# Altium footprint library pcb2D3D库101.PcbLib: 411 footprints (part 9 of 26)
Each footprint in its own frame and in the unit in brackets; x right, y up, seen from the top. Pads: shape width x height; smd on the part's side, far side on the other; paste and mask are expansions set on the pad; w line width, h text height; cw(c..) or ccw(c..) is an arc to the next point about the centre after c.
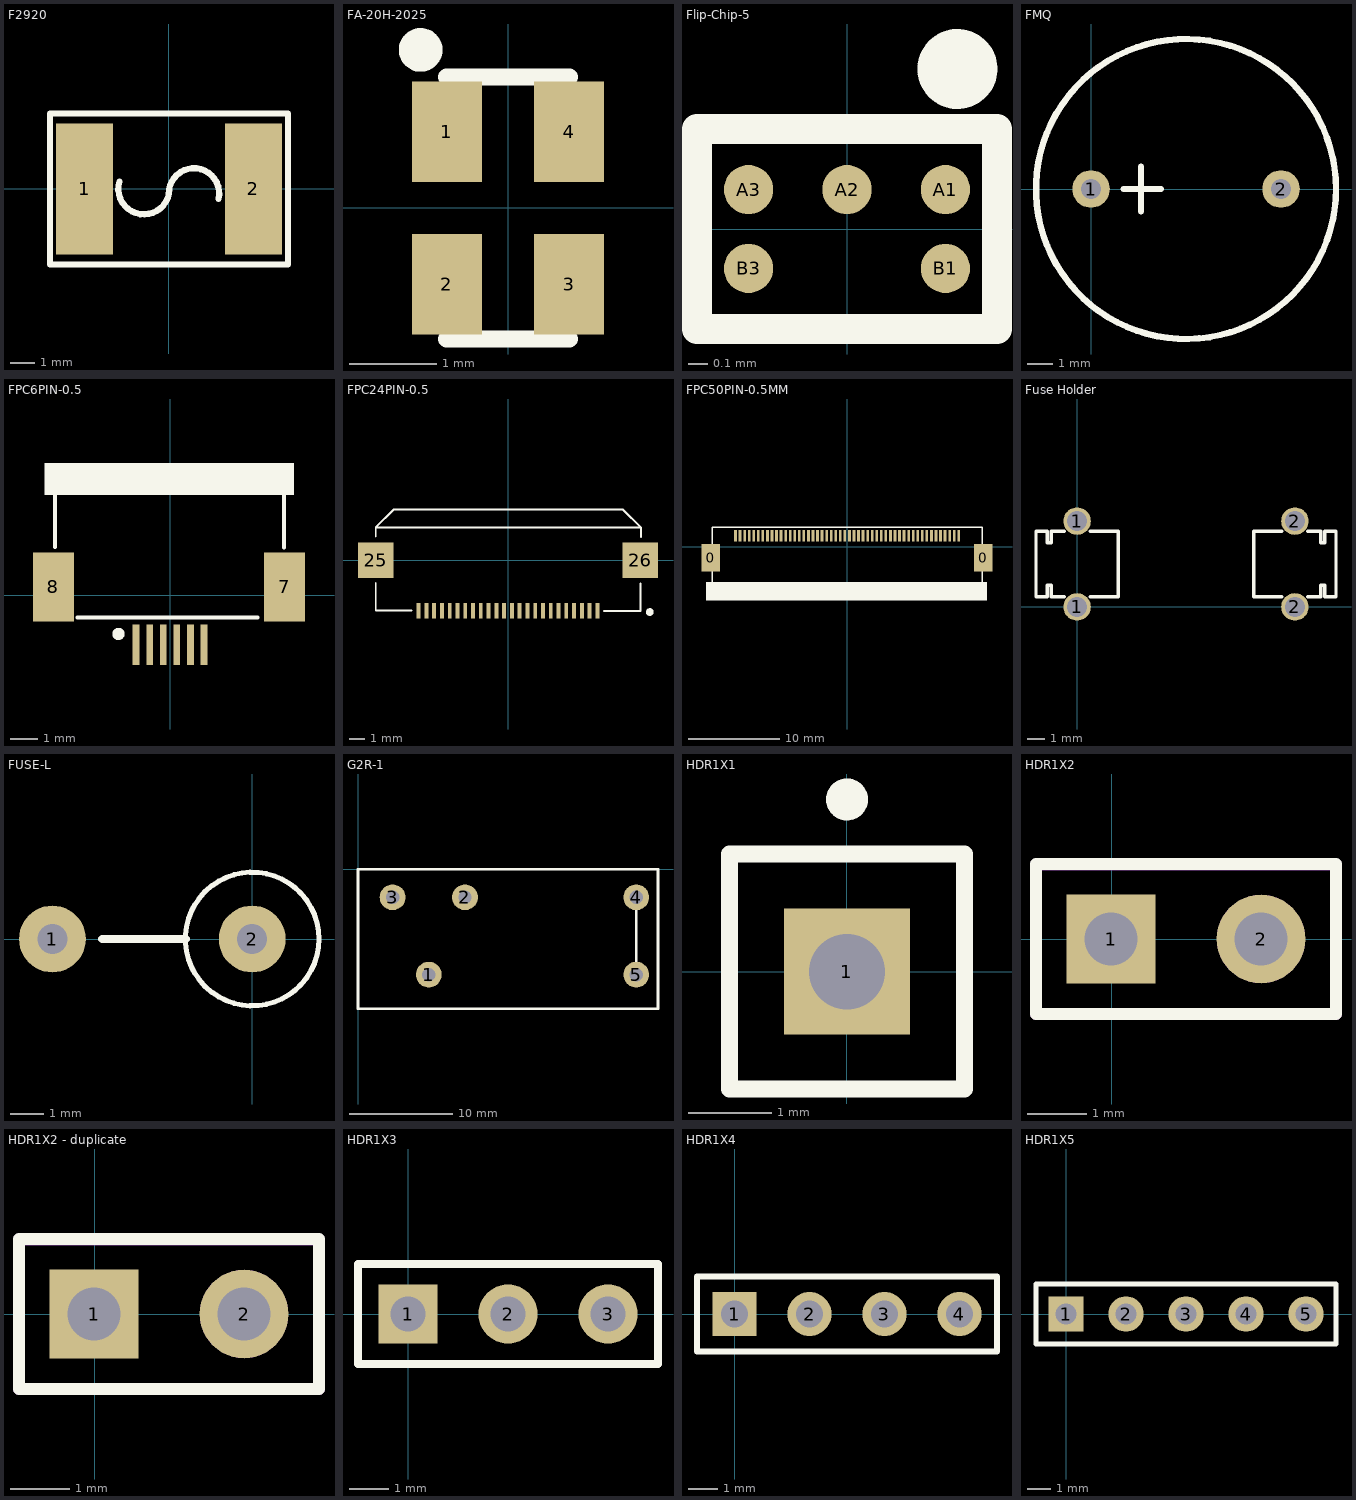
[diagram p8: the footprints below, top view; thin cyan lines are the x and y axes]

## F2920 [mm] "7452"
pads (2):
  rect 2.3x5.3 smd: 1(-3.4,0) 2(3.4,0)
TopOverlay:
  lines w0.254: -2,0.3 ccw(c-1.012,0.007) 0.018,0 ; -0.009,-0.2 cw(c1.008,-0.178) 2,-0.4 ; -4.8,-3.048 4.8,-3.048 4.8,3.048 -4.8,3.048 -4.8,-3.048
3D body: height 1, standoff 0, extent 2.7,-2.692 3.399,2.692
3D body: height 1, standoff 0, extent -3.576,-2.718 -2.878,2.667
3D body: height 1, standoff 0, extent -2.878,-2.718 3.18,2.667

## FA-20H-2025 [mm]
height 0.5
pads (4):
  rect 0.8x1.15 smd: 1(-0.7,0.875) 2(-0.7,-0.875) 3(0.7,-0.875) 4(0.7,0.875)
TopOverlay:
  circle w0.25: c-1,1.81 r0.125
  lines w0.2: -0.7,-1.5 0.7,-1.5 ; -0.7,1.5 0.7,1.5
3D body "FA-20H-2025.STEP": height 0.5, standoff 0, extent -1.005,-1.25 0.995,1.25

## Flip-Chip-5 [mm]
height 0.69
pads (5):
  round 0.25 smd mask+0.05: A1(0.5,0.2) A2(0,0.2) A3(-0.5,0.2) B1(0.5,-0.2) B3(-0.5,-0.2)
TopOverlay:
  circle w0.203: c0.561,0.813 r0.102
  lines w0.152: -0.762,-0.508 -0.762,0.508 0.762,0.508 0.762,-0.508 -0.762,-0.508
3D body "FlipChip-5.STEP": height 0.69, standoff 0, extent -0.693,-0.425 0.693,0.43

## FMQ [mm]
pads (2):
  round 1.5 hole 0.8: 1(0,0) 2(7.6,0)
TopOverlay:
  circle w0.254: c3.799,0 r6.001
  lines w0.254: 1.3,0 2.8,0 ; 2,-0.9 2,0.9
3D body "User Library-WST-1203UX.STEP": height 9.65, standoff -4.5, extent -5.727,-6 9.727,6

## FPC6PIN-0.5 [mm]
pads (8):
  rect 0.25x1.5 smd: 1(-1.25,-1.825) 2(-0.75,-1.825) 3(-0.25,-1.825) 4(0.25,-1.825) 5(0.75,-1.825) 6(1.25,-1.825)
  rect 1.524x2.54 smd: 7(4.216,0.305) 8(-4.293,0.305)
TopOverlay:
  circle w0.254: c-1.9,-1.425 r0.1
  region: 3,4.775 3,4.775 3,4.425 3,4.425
  region: 4.572,4.877 -4.623,4.877 -4.623,3.683 4.572,3.683
  lines w0.15: -4.242,1.778 -4.242,4.775 3.835,4.775 ; -3.404,-0.825 3,-0.825 ; 2.6,-0.825 3.226,-0.825 ; 4.191,1.753 4.191,4.724
3D body "FFC6PIN卧": height 2.12, standoff -0.19, extent -4.603,-1.973 4.552,4.674

## FPC24PIN-0.5 [mm] "CAMERA ROTARY FPC 24 WAY 0.5 PITCH"
pads (26):
  rect 0.25x1 smd: 1(5.75,-3.25) 2(5.25,-3.25) 3(4.75,-3.25) 4(4.25,-3.25) 5(3.75,-3.25) 6(3.25,-3.25) 7(2.75,-3.25) 8(2.25,-3.25) 9(1.75,-3.25) 10(1.25,-3.25) 11(0.75,-3.25) 12(0.25,-3.25) 13(-0.25,-3.25) 14(-0.75,-3.25) 15(-1.25,-3.25) 16(-1.75,-3.25) 17(-2.25,-3.25) 18(-2.75,-3.25) 19(-3.25,-3.25) 20(-3.75,-3.25) 21(-4.25,-3.25) 22(-4.75,-3.25) 23(-5.25,-3.25) 24(-5.75,-3.25)
  rect 2.286x2.286 smd: 25(-8.509,0) 26(8.509,0)
TopOverlay:
  circle w0.254: c9.123,-3.34 r0.117
  lines w0.127: -8.51,-3.251 -8.51,-1.48 ; -8.51,1.51 -8.51,2.11 ; 8.53,-3.251 8.53,-1.5 ; 8.54,2.11 -8.51,2.11 ; 8.56,1.49 8.56,2.09 7.399,3.251 -7.369,3.251 -8.51,2.11
  lines w0.128: -8.5,-3.24 -6.22,-3.24 ; 6.18,-3.26 8.53,-3.26
3D body "User Library-ov9655.STEP": height 5.85, standoff -0.18, extent -6.17,-0.55 6.33,20.95
3D body "33944.STEP": height 2, standoff 0, extent -8.04,-4.56 8.06,1.34

## FPC50PIN-0.5MM [mm]
pads (52):
  rect 2x3 smd: 0(-14.986,-1.219) 0(14.935,-1.219)
  rect 0.3x1.25 smd: 1(12.24,1.181) 2(11.74,1.181) 3(11.24,1.181) 4(10.74,1.181) 5(10.24,1.181) 6(9.74,1.181) 7(9.24,1.181) 8(8.74,1.181) 9(8.24,1.181) 10(7.74,1.181) 11(7.24,1.181) 12(6.74,1.181) 13(6.24,1.181) 14(5.74,1.181) 15(5.24,1.181) 16(4.74,1.181) 17(4.24,1.181) 18(3.74,1.181) 19(3.24,1.181) 20(2.74,1.181) 21(2.24,1.181) 22(1.74,1.181) 23(1.24,1.181) 24(0.74,1.181) 25(0.24,1.181) 26(-0.26,1.181) 27(-0.76,1.181) 28(-1.26,1.181) 29(-1.76,1.181) 30(-2.26,1.181) 31(-2.76,1.181) 32(-3.26,1.181) 33(-3.76,1.181) 34(-4.26,1.181) 35(-4.76,1.181) 36(-5.26,1.181) 37(-5.76,1.181) 38(-6.26,1.181) 39(-6.76,1.181) 40(-7.26,1.181) 41(-7.76,1.181) 42(-8.26,1.181) 43(-8.76,1.181) 44(-9.26,1.181) 45(-9.76,1.181) 46(-10.26,1.181) 47(-10.76,1.181) 48(-11.26,1.181) 49(-11.76,1.181) 50(-12.26,1.181)
TopOverlay:
  rectangle: -15.494,-5.944 15.342,-3.886
  lines w0.2: -14.808,-4.928 14.808,-4.928 14.808,2.108 -14.808,2.108 -14.808,-4.928
3D body "FFC50IPIN卧": height 2.1, standoff 0.05, extent -15.26,-5.759 15.24,1.391

## Fuse Holder [mm]
pads (4):
  round 1.6 hole 1.17 mask+0.06: 1(0,0) 1(0,5) 2(12.7,0) 2(12.7,5)
TopOverlay:
  lines w0.2: -0.75,0.6 -1.5,0.6 -1.5,1.25 -1.75,1.25 -1.75,0.6 -2.4,0.6 -2.4,4.4 -1.75,4.4 -1.75,3.75 -1.5,3.75 -1.5,4.4 -0.75,4.4 ; 0.75,0.6 2.4,0.6 2.4,4.4 0.75,4.4 ; 11.95,0.6 10.3,0.6 10.3,4.4 11.95,4.4 ; 13.45,0.6 14.2,0.6 14.2,1.25 14.45,1.25 14.45,0.6 15.1,0.6 15.1,4.4 14.45,4.4 14.45,3.75 14.2,3.75 14.2,4.4 13.45,4.4
3D body "User Library-01110501Z.STEP": height 7.4, standoff -2.95, extent -2.275,0 2.525,5.1
3D body "User Library-01110501Z.STEP": height 7.4, standoff -2.95, extent 10.325,0 15.125,5.1

## FUSE-L [mil]
height 511.81
pads (2):
  round 79 hole 35.43: 1(-236.22,0) 2(0,0)
TopOverlay:
  circle w6: c0,0 r79
  lines w10: -177.17,0 -78.74,0
3D body "保险": height 545.04, standoff -77.66, extent -249.02,-74.21 77.68,83.27

## G2R-1 [mm]
pads (5):
  round 2.5 hole 1.3: 1(6.858,-10.211) 2(10.363,-2.718) 3(3.353,-2.718) 4(26.949,-2.718) 5(26.949,-10.211)
TopOverlay:
  lines w0.254: 26.949,-10.211 26.949,-2.718 ; 0,-13.513 0,0 29.058,0 29.058,-13.513 0,-13.513
3D body "relay_g2rk-1_48dc.stp": height 25.5, standoff -4, extent 0.079,-13.583 29.08,-0.083

## HDR1X1 [mm] "Generic Antenna; 1 Lead"
pads (1):
  rect 1.5x1.5 hole 0.9: 1(0,0)
TopOverlay:
  circle w0.25: c0,2.05 r0.125
  lines w0.2: -1.4,-1.4 1.4,-1.4 1.4,1.4 -1.4,1.4 -1.4,-1.4
3D body "1001-1.STEP": height 8.54, standoff -3, extent -1.27,-1.27 1.27,1.27

## HDR1X2 [mm]
height 1.1
pads (2):
  rect 1.5x1.5 hole 0.9: 1(-0.01,0.007)
  round 1.5 hole 0.9: 2(2.53,0.007)
TopOverlay:
  lines w0.2: -1.28,-1.263 3.8,-1.263 3.8,1.277 -1.28,1.277 -1.28,-1.263
Mechanical7:
  circle w0.2: c2.53,0.007 r0.648
  lines w0.2: -1.28,-1.263 -1.28,1.27 3.8,1.27 3.8,-1.263 -1.28,-1.263 ; -0.645,-0.628 0.625,-0.628 0.625,0.642 -0.645,0.642 -0.645,-0.628
3D body "1x2HDR.stp": height 8.41, standoff -2.52, extent -1.279,-1.261 3.801,1.279

## HDR1X2 - duplicate [mm]
height 1.1
pads (2):
  rect 1.5x1.5 hole 0.9: 1(-0.01,0.007)
  round 1.5 hole 0.9: 2(2.53,0.007)
TopOverlay:
  lines w0.2: -1.28,-1.263 3.8,-1.263 3.8,1.277 -1.28,1.277 -1.28,-1.263
Mechanical7:
  circle w0.2: c2.53,0.007 r0.648
  lines w0.2: -1.28,-1.263 -1.28,1.27 3.8,1.27 3.8,-1.263 -1.28,-1.263 ; -0.645,-0.628 0.625,-0.628 0.625,0.642 -0.645,0.642 -0.645,-0.628
3D body "1x2HDR.stp": height 8.41, standoff -2.52, extent -1.279,-1.261 3.801,1.279

## HDR1X3 [mm] "Connector; Header; 3 Position"
height 1
pads (3):
  rect 1.5x1.5 hole 0.9: 1(0,0)
  round 1.5 hole 0.9: 2(2.54,0) 3(5.08,0)
TopOverlay:
  lines w0.2: -1.27,-1.27 -1.27,1.27 6.35,1.27 6.35,-1.27 -1.27,-1.27
3D body "1001-3.STEP": height 8.54, standoff -3, extent -1.27,-1.321 6.35,1.219

## HDR1X4 [mm] "Connector; Header; 4 Position"
height 1
pads (4):
  rect 1.5x1.5 hole 0.9: 1(0,0)
  round 1.5 hole 0.9: 2(2.54,0) 3(5.08,0) 4(7.62,0)
TopOverlay:
  lines w0.2: -1.27,-1.27 -1.27,1.27 8.89,1.27 8.89,-1.27 -1.27,-1.27
3D body "1001-4.STEP": height 8.54, standoff -3, extent -1.263,-1.267 8.897,1.273

## HDR1X5 [mm] "Connector; Header; 5 Position"
height 1
pads (5):
  rect 1.5x1.5 hole 0.9: 1(0,0)
  round 1.5 hole 0.9: 2(2.54,0) 3(5.08,0) 4(7.62,0) 5(10.16,0)
TopOverlay:
  lines w0.2: -1.27,-1.27 11.43,-1.27 11.43,1.27 -1.27,1.27 -1.27,-1.27
3D body "0.1inch Pin Strip-5Way.STEP": height 10.1, standoff -1.5, extent -1.27,-1.27 11.43,1.27